# Altium footprint library Wurth_Elektronik_Electromechanic_Wire_to_Board_Connectors_rev16a.PCBLIB: 662 footprints (part 42 of 42)
Each footprint in its own frame and in the unit in brackets; x right, y up, seen from the top. Pads: shape width x height; smd on the part's side, far side on the other; paste and mask are expansions set on the pad; w line width, h text height; cw(c..) or ccw(c..) is an arc to the next point about the centre after c.
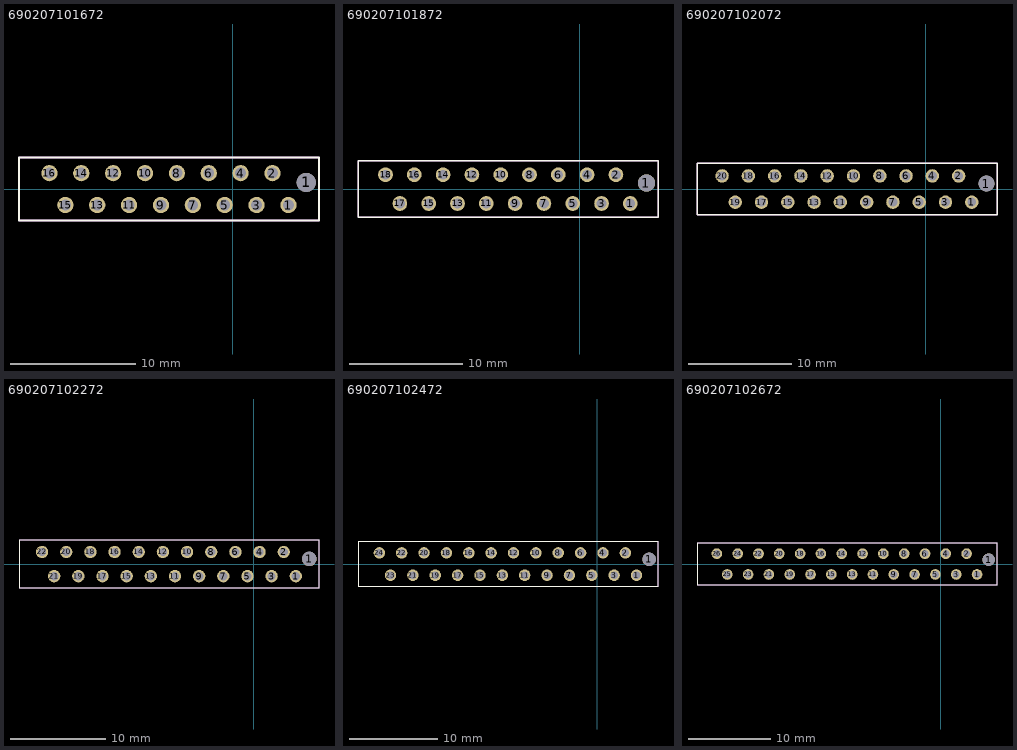
[diagram p41: the footprints below, top view; thin cyan lines are the x and y axes]

## 690207101672 [mil]
pads (17):
  round 51 hole 34: 1(175,-50) 2(125,50) 3(75,-50) 4(25,50) 5(-25,-50) 6(-75,50) 7(-125,-50) 8(-175,50) 9(-225,-50) 10(-275,50) 11(-325,-50) 12(-375,50) 13(-425,-50) 14(-475,50) 15(-525,-50) 16(-575,50)
  round 60 hole 60: 1(231,21)
Top Overlay:
  lines w5: -670.47,-98.43 271,-98.43 271,99 -670.47,99 -670.47,-98.43
Mechanical 2:
  text ">NAME" at -264.66,118 h77.5
Mechanical 4:
  text ">VALUE" at -289.66,-181.27 h77.5
Mechanical 16:
  lines w5: -670.47,-98.43 -670.47,99 271,99 271,-98.43 -670.47,-98.43
  text "1" at 173,-72.05 h77.5
  text "16" at -625,25 h77.5

## 690207101872 [mil]
pads (19):
  round 51 hole 34: 1(175,-50) 2(125,50) 3(75,-50) 4(25,50) 5(-25,-50) 6(-75,50) 7(-125,-50) 8(-175,50) 9(-225,-50) 10(-275,50) 11(-325,-50) 12(-375,50) 13(-425,-50) 14(-475,50) 15(-525,-50) 16(-575,50) 17(-625,-50) 18(-675,50)
  round 60 hole 60: 1(231,21)
Top Overlay:
  lines w5: -770.47,-98.43 271,-98.43 271,99 -770.47,99 -770.47,-98.43
Mechanical 2:
  text ">NAME" at -364.66,118 h77.5
Mechanical 4:
  text ">VALUE" at -389.66,-181.27 h77.5
Mechanical 16:
  lines w5: -770.47,-98.43 -770.47,99 271,99 271,-98.43 -770.47,-98.43
  text "1" at 173,-72.05 h77.5
  text "18" at -725,25 h77.5

## 690207102072 [mil]
pads (21):
  round 51 hole 34: 1(175,-50) 2(125,50) 3(75,-50) 4(25,50) 5(-25,-50) 6(-75,50) 7(-125,-50) 8(-175,50) 9(-225,-50) 10(-275,50) 11(-325,-50) 12(-375,50) 13(-425,-50) 14(-475,50) 15(-525,-50) 16(-575,50) 17(-625,-50) 18(-675,50) 19(-725,-50) 20(-775,50)
  round 60 hole 60: 1(231,21)
Top Overlay:
  lines w5: -870.47,-98.43 271,-98.43 271,99 -870.47,99 -870.47,-98.43
Mechanical 2:
  text ">NAME" at -364.66,118 h77.5
Mechanical 4:
  text ">VALUE" at -389.66,-181.27 h77.5
Mechanical 16:
  lines w5: -870.47,-98.43 -870.47,99 271,99 271,-98.43 -870.47,-98.43
  text "1" at 173,-72.05 h77.5
  text "20" at -800,25 h77.5

## 690207102272 [mil]
pads (23):
  round 51 hole 34: 1(175,-50) 2(125,50) 3(75,-50) 4(25,50) 5(-25,-50) 6(-75,50) 7(-125,-50) 8(-175,50) 9(-225,-50) 10(-275,50) 11(-325,-50) 12(-375,50) 13(-425,-50) 14(-475,50) 15(-525,-50) 16(-575,50) 17(-625,-50) 18(-675,50) 19(-725,-50) 20(-775,50) 21(-825,-50) 22(-875,50)
  round 60 hole 60: 1(231,21)
Top Overlay:
  lines w5: -970.47,-98.43 271,-98.43 271,99 -970.47,99 -970.47,-98.43
Mechanical 2:
  text ">NAME" at -364.66,118 h77.5
Mechanical 4:
  text ">VALUE" at -389.66,-181.27 h77.5
Mechanical 16:
  lines w5: -970.47,-98.43 -970.47,99 271,99 271,-98.43 -970.47,-98.43
  text "1" at 173,-72.05 h77.5
  text "22" at -925,25 h77.5

## 690207102472 [mil]
pads (25):
  round 51 hole 34: 1(175,-50) 2(125,50) 3(75,-50) 4(25,50) 5(-25,-50) 6(-75,50) 7(-125,-50) 8(-175,50) 9(-225,-50) 10(-275,50) 11(-325,-50) 12(-375,50) 13(-425,-50) 14(-475,50) 15(-525,-50) 16(-575,50) 17(-625,-50) 18(-675,50) 19(-725,-50) 20(-775,50) 21(-825,-50) 22(-875,50) 23(-925,-50) 24(-975,50)
  round 60 hole 60: 1(231,21)
Top Overlay:
  lines w5: -1070.47,-98.43 271,-98.43 271,99 -1070.47,99 -1070.47,-98.43
Mechanical 2:
  text ">NAME" at -364.66,118 h77.5
Mechanical 4:
  text ">VALUE" at -389.66,-181.27 h77.5
Mechanical 16:
  lines w5: -1070.47,-98.43 -1070.47,99 271,99 271,-98.43 -1070.47,-98.43
  text "1" at 173,-72.05 h77.5
  text "24" at -1025,25 h77.5

## 690207102672 [mil]
pads (27):
  round 51 hole 34: 1(175,-50) 2(125,50) 3(75,-50) 4(25,50) 5(-25,-50) 6(-75,50) 7(-125,-50) 8(-175,50) 9(-225,-50) 10(-275,50) 11(-325,-50) 12(-375,50) 13(-425,-50) 14(-475,50) 15(-525,-50) 16(-575,50) 17(-625,-50) 18(-675,50) 19(-725,-50) 20(-775,50) 21(-825,-50) 22(-875,50) 23(-925,-50) 24(-975,50) 25(-1025,-50) 26(-1075,50)
  round 60 hole 60: 1(231,21)
Top Overlay:
  lines w5: -1170.47,-98.43 271,-98.43 271,99 -1170.47,99 -1170.47,-98.43
Mechanical 2:
  text ">NAME" at -514.66,118 h77.5
Mechanical 4:
  text ">VALUE" at -539.66,-181.27 h77.5
Mechanical 16:
  lines w5: -1170.47,-98.43 -1170.47,99 271,99 271,-98.43 -1170.47,-98.43
  text "1" at 173,-72.05 h77.5
  text "26" at -1125,25 h77.5